# Altium footprint library General.PCBLIB: 231 footprints (part 6 of 15)
Each footprint in its own frame and in the unit in brackets; x right, y up, seen from the top. Pads: shape width x height; smd on the part's side, far side on the other; paste and mask are expansions set on the pad; w line width, h text height; cw(c..) or ccw(c..) is an arc to the next point about the centre after c.
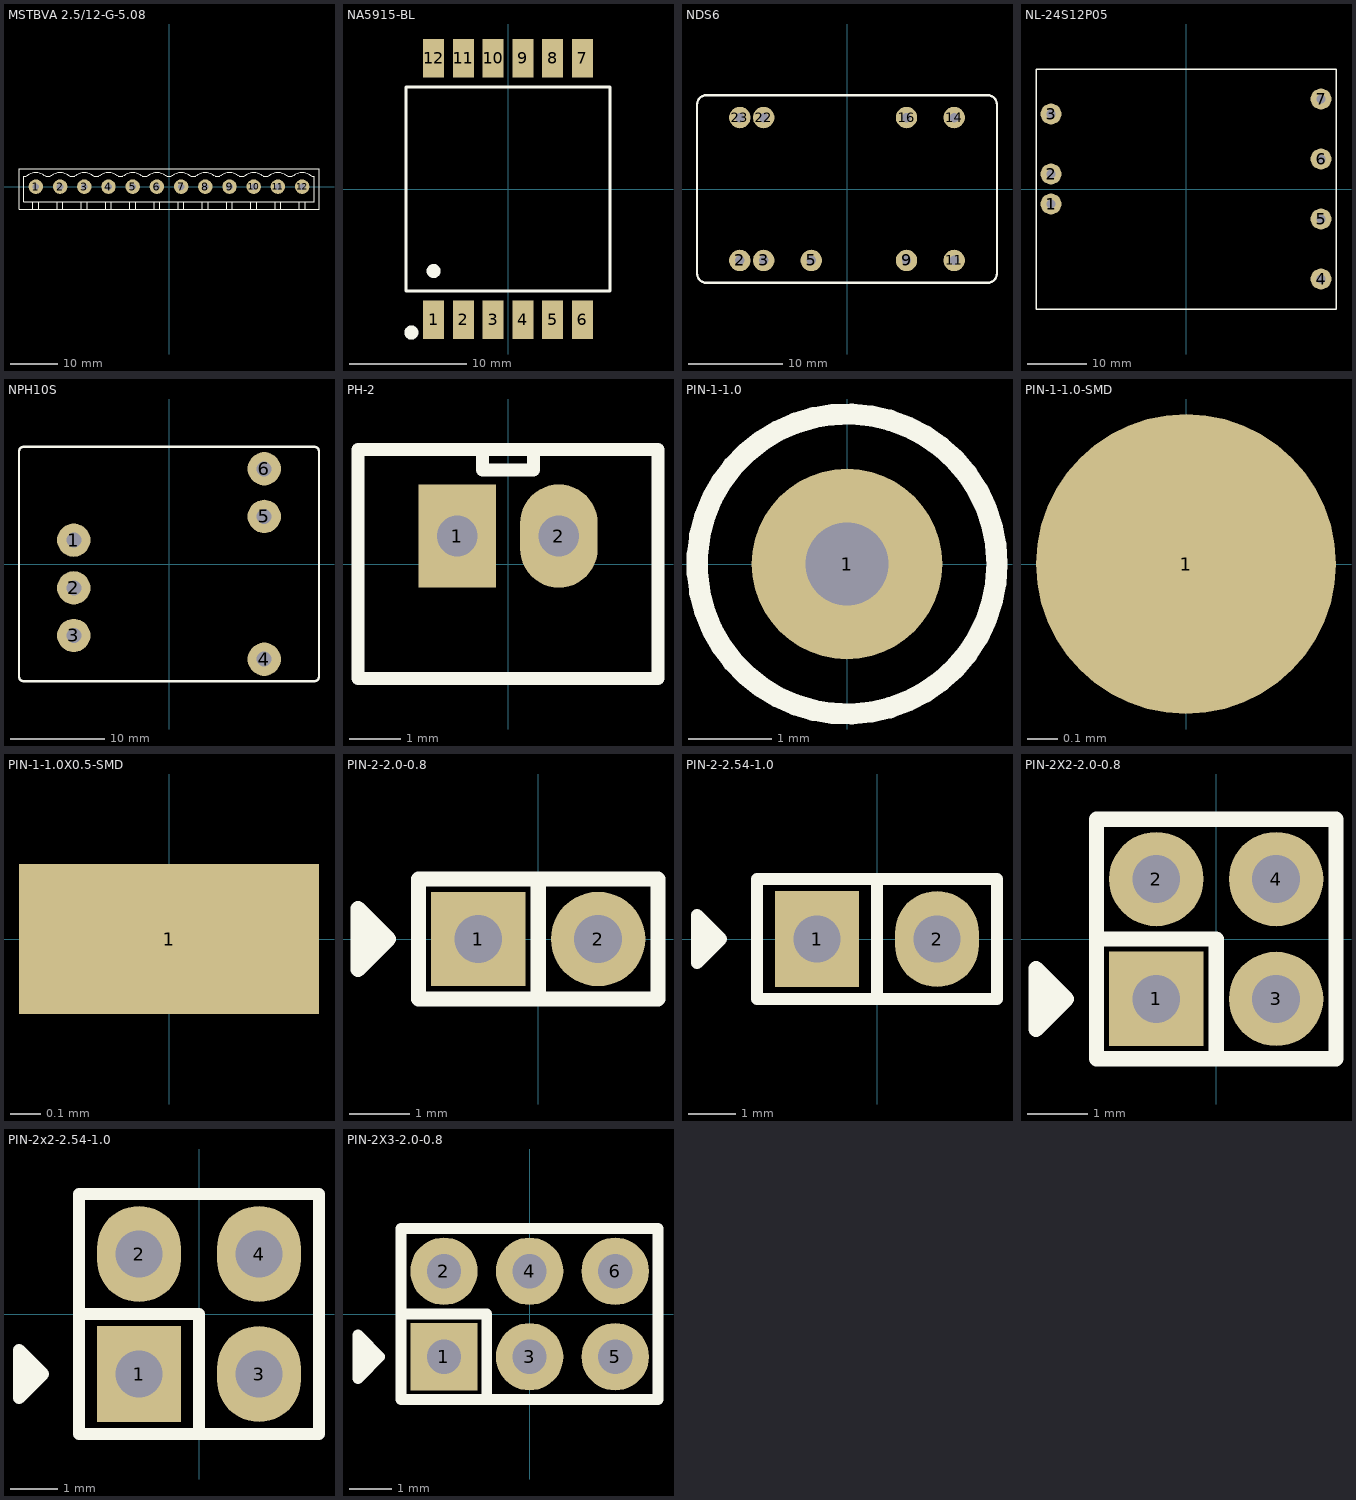
[diagram p5: the footprints below, top view; thin cyan lines are the x and y axes]

## MSTBVA 2.5/12-G-5.08 [mil] "Socket, PHOENIX CONTACT"
height 472.44
pads (12):
  round 120 hole 55.12: 1(-1100,0) 2(-900,0) 3(-700,0) 4(-500,0) 5(-300,0) 6(-100,0) 7(100,0) 8(300,0) 9(500,0) 10(700,0) 11(900,0) 12(1100,0)
Top Overlay:
  lines w10: -1123.82,-188.98 -1123.82,-124.54 ; -1076.18,-188.98 -1076.18,-124.54 ; -923.82,-188.98 -923.82,-124.54 ; -876.18,-188.98 -876.18,-124.54 ; -723.82,-188.98 -723.82,-124.54 ; -676.18,-188.98 -676.18,-124.54 ; -523.82,-188.98 -523.82,-124.54 ; -476.18,-188.98 -476.18,-124.54 ; -323.82,-188.98 -323.82,-124.54 ; -276.18,-188.98 -276.18,-124.54 ; -123.82,-188.98 -123.82,-124.54 ; -76.18,-188.98 -76.18,-124.54 ; 76.18,-188.98 76.18,-124.54 ; 123.82,-188.98 123.82,-124.54 ; 276.18,-188.98 276.18,-124.54 ; 323.82,-188.98 323.82,-124.54 ; 476.18,-188.98 476.18,-124.54 ; 523.82,-188.98 523.82,-124.54 ; 676.18,-188.98 676.18,-124.54 ; 723.82,-188.98 723.82,-124.54 ; 876.18,-188.98 876.18,-124.54 ; 923.82,-188.98 923.82,-124.54 ; 1076.18,-188.98 1076.18,-124.54 ; 1123.82,-188.98 1123.82,-124.54 ; -1239.37,-188.98 -1239.37,149.61 1239.37,149.61 1239.37,-188.98 -1239.37,-188.98 ; -1200,-124.54 -1200,83.86 -1180.3,83.86 cw(c-1100,-2.76) -1019.7,83.86 -980.3,83.86 cw(c-900,-2.76) -819.7,83.86 -780.3,83.86 cw(c-700,-2.76) -619.7,83.86 -580.3,83.86 cw(c-500,-2.76) -419.7,83.86 -380.3,83.86 cw(c-300,-2.76) -219.7,83.86 -180.3,83.86 cw(c-100,-2.76) -19.7,83.86 19.7,83.86 cw(c100,-2.76) 180.3,83.86 219.7,83.86 cw(c300,-2.76) 380.3,83.86 419.7,83.86 cw(c500,-2.76) 580.3,83.86 619.7,83.86 cw(c700,-2.76) 780.3,83.86 819.7,83.86 cw(c900,-2.76) 980.3,83.86 1019.7,83.86 cw(c1100,-2.76) 1180.3,83.86 1200,83.86 1200,-124.54 -1200,-124.54
3D body "MSTBVA 2.5_12-G-5.08.step": height 472.44, standoff -153.54, extent -1239.37,-188.98 1239.37,149.61

## NA5915-BL [mm] "Transformer, Coilcraft, NA5915-BL"
height 10
pads (12):
  rect 1.79x3.3 smd: 1(-6.35,-11.15) 2(-3.81,-11.15) 3(-1.27,-11.15) 4(1.27,-11.15) 5(3.81,-11.15) 6(6.35,-11.15) 7(6.35,11.15) 8(3.81,11.15) 9(1.27,11.15) 10(-1.27,11.15) 11(-3.81,11.15) 12(-6.35,11.15)
Top Overlay:
  circle w0.7: c-6.35,-7 r0.25
  circle w0.7: c-8.25,-12.25 r0.25
  lines w0.254: -8.7,-8.7 8.7,-8.7 8.7,8.7 -8.7,8.7 -8.7,-8.7
3D body "TRANSFORMER-EFD15.step": height 8.3, standoff 0, extent -8.75,-11.05 8.75,11.05

## NDS6 [mil] "MURATA POWER"
height 393.7
pads (9):
  round 90 hole 39.37: 2(-450,-300) 3(-350,-300) 5(-150,-300) 9(250,-300) 11(450,-300) 14(450,300) 16(250,300) 22(-350,300) 23(-450,300)
Top Overlay:
  lines w10: -629.92,-354.33 ccw(c-590.55,-354.33) -590.55,-393.7 590.55,-393.7 ccw(c590.55,-354.33) 629.92,-354.33 629.92,354.33 ccw(c590.55,354.33) 590.55,393.7 -590.55,393.7 ccw(c-590.55,354.33) -629.92,354.33 -629.92,-354.33
3D body: height 393.7, standoff 0, extent -629.92,-393.7 629.92,393.7

## NL-24S12P05 [mil] "NINGLU POWER"
height 275.59
pads (7):
  round 140 hole 59.06: 1(-900,-100) 2(-900,100) 3(-900,500) 4(900,-600) 5(900,-200) 6(900,200) 7(900,600)
Top Overlay:
  lines w10: -1000,-800 -1000,800 1000,800 1000,-800 -1000,-800
3D body: height 275.59, standoff 0, extent -1000,-800 1000,800

## NPH10S [mil] "MURATA POWER"
height 393.7
pads (6):
  round 140 hole 62.99: 1(-400,100) 2(-400,-100) 3(-400,-300) 4(400,-400) 5(400,200) 6(400,400)
Top Overlay:
  lines w10: -629.92,-472.13 ccw(c-609.92,-472.13) -609.92,-492.13 609.92,-492.13 ccw(c609.92,-472.13) 629.92,-472.13 629.92,472.13 ccw(c609.92,472.13) 609.92,492.13 -609.92,492.13 ccw(c-609.92,472.13) -629.92,472.13 -629.92,-472.13
3D body: height 393.7, standoff 0, extent -629.92,-492.13 629.92,492.13

## PCBComponent_1 [mm]

## PCBComponent_1 - duplicate [mm]

## PH-2 [mm] "Pin Header"
height 6
pads (2):
  rect 1.524x2.032 hole 0.8: 1(-1,0.55)
  oval 1.524x2.032 hole 0.8: 2(1,0.55)
Top Overlay:
  lines w0.254: -0.5,2.25 -0.5,1.85 0.5,1.85 0.5,2.25 ; -2.95,-2.25 -2.95,2.25 2.95,2.25 2.95,-2.25 -2.95,-2.25
3D body "PH-2.STEP": height 6, standoff -1.91, extent -2.95,-2.25 3.05,2.25

## PIN-1-1.0 [mil] "Pin Header"
height 374.02
pads (1):
  round 90 hole 39.37: 1(0,0)
Top Overlay:
  circle w10: c0,0 r70.87
3D body "PIN1.STEP": height 397.64, standoff -59.06, extent -50,-50 50,50

## PIN-1-1.0-SMD [mm] "Test Point"
pads (1):
  round 1 smd: 1(0,0)

## PIN-1-1.0X0.5-SMD [mm] "Test Point"
pads (1):
  rect 1x0.5 smd: 1(0,0)

## PIN-2-2.0-0.8 [mm] "Pin Header"
height 3.8
pads (2):
  rect 1.575x1.575 hole 0.8: 1(-1,0)
  round 1.575 hole 0.8: 2(1,0)
Top Overlay:
  lines w0.254: -2.754,-0.254 -2.754,0.254 ; 0,-1 0,1 ; -3.008,-0.508 -2.5,0 -3.008,0.508 -3.008,-0.508 ; -2,-1 -2,1 2,1 2,-1 -2,-1
3D body "Samtec-MTMM-102-02-G-S-150.STEP": height 5.31, standoff -1.17, extent -2,-1 1.998,0.999

## PIN-2-2.54-1.0 [mil] "Pin Header"
height 374.02
pads (2):
  rect 70x80 hole 39.37: 1(-50,0)
  oval 70x80 hole 39.37: 2(50,0)
Top Overlay:
  lines w10: -140,-10 -140,10 ; 0,-50 0,50 ; -150,-20 -130,0 -150,20 -150,-20 ; -100,-50 100,-50 100,50 -100,50 -100,-50
3D body "PIN2_100mils.STEP": height 397.64, standoff -59.06, extent -100,-50 100,50

## PIN-2X2-2.0-0.8 [mm] "Pin Header"
height 3.8
pads (4):
  rect 1.575x1.575 hole 0.8: 1(-1,-1)
  round 1.575 hole 0.8: 2(-1,1) 3(1,-1) 4(1,1)
Top Overlay:
  lines w0.254: -2.754,-1.254 -2.754,-0.746 ; -2,0 0,0 0,-2 ; -3.008,-1.508 -2.5,-1 -3.008,-0.492 -3.008,-1.508 ; -2,-2 -2,2 2,2 2,-2 -2,-2
3D body "Samtec-MTMM-102-02-G-D-150.STEP": height 5.31, standoff -1.17, extent -2,-2 1.998,1.998

## PIN-2x2-2.54-1.0 [mil] "Pin Header"
height 374.02
pads (4):
  rect 70x80 hole 39.37: 1(-50,-50)
  oval 70x80 hole 39.37: 2(-50,50) 3(50,-50) 4(50,50)
Top Overlay:
  lines w10: -140,-60 -140,-40 ; -100,0 0,0 0,-100 ; -150,-70 -150,-30 -130,-50 -150,-70 ; -100,-100 100,-100 100,100 -100,100 -100,-100
3D body "Pin2x2_100mils.STEP": height 397.64, standoff -59.06, extent -100,-100 100,100

## PIN-2X3-2.0-0.8 [mm] "Pin Header"
height 3.8
pads (6):
  rect 1.575x1.575 hole 0.8: 1(-2,-1)
  round 1.575 hole 0.8: 2(-2,1) 3(0,-1) 4(0,1) 5(2,-1) 6(2,1)
Top Overlay:
  lines w0.254: -3.754,-1.254 -3.754,-0.746 ; -3,0 -1,0 -1,-2 ; -4.008,-1.508 -4.008,-0.492 -3.5,-1 -4.008,-1.508 ; -3,-2 3,-2 3,2 -3,2 -3,-2
3D body "Samtec-MTMM-103-02-G-D-150.STEP": height 5.31, standoff -1.17, extent -3,-2 2.997,1.998